# Altium footprint library TempdevAmmy.PcbLib: 42 footprints (part 2 of 3)
Each footprint in its own frame and in the unit in brackets; x right, y up, seen from the top. Pads: shape width x height; smd on the part's side, far side on the other; paste and mask are expansions set on the pad; w line width, h text height; cw(c..) or ccw(c..) is an arc to the next point about the centre after c.
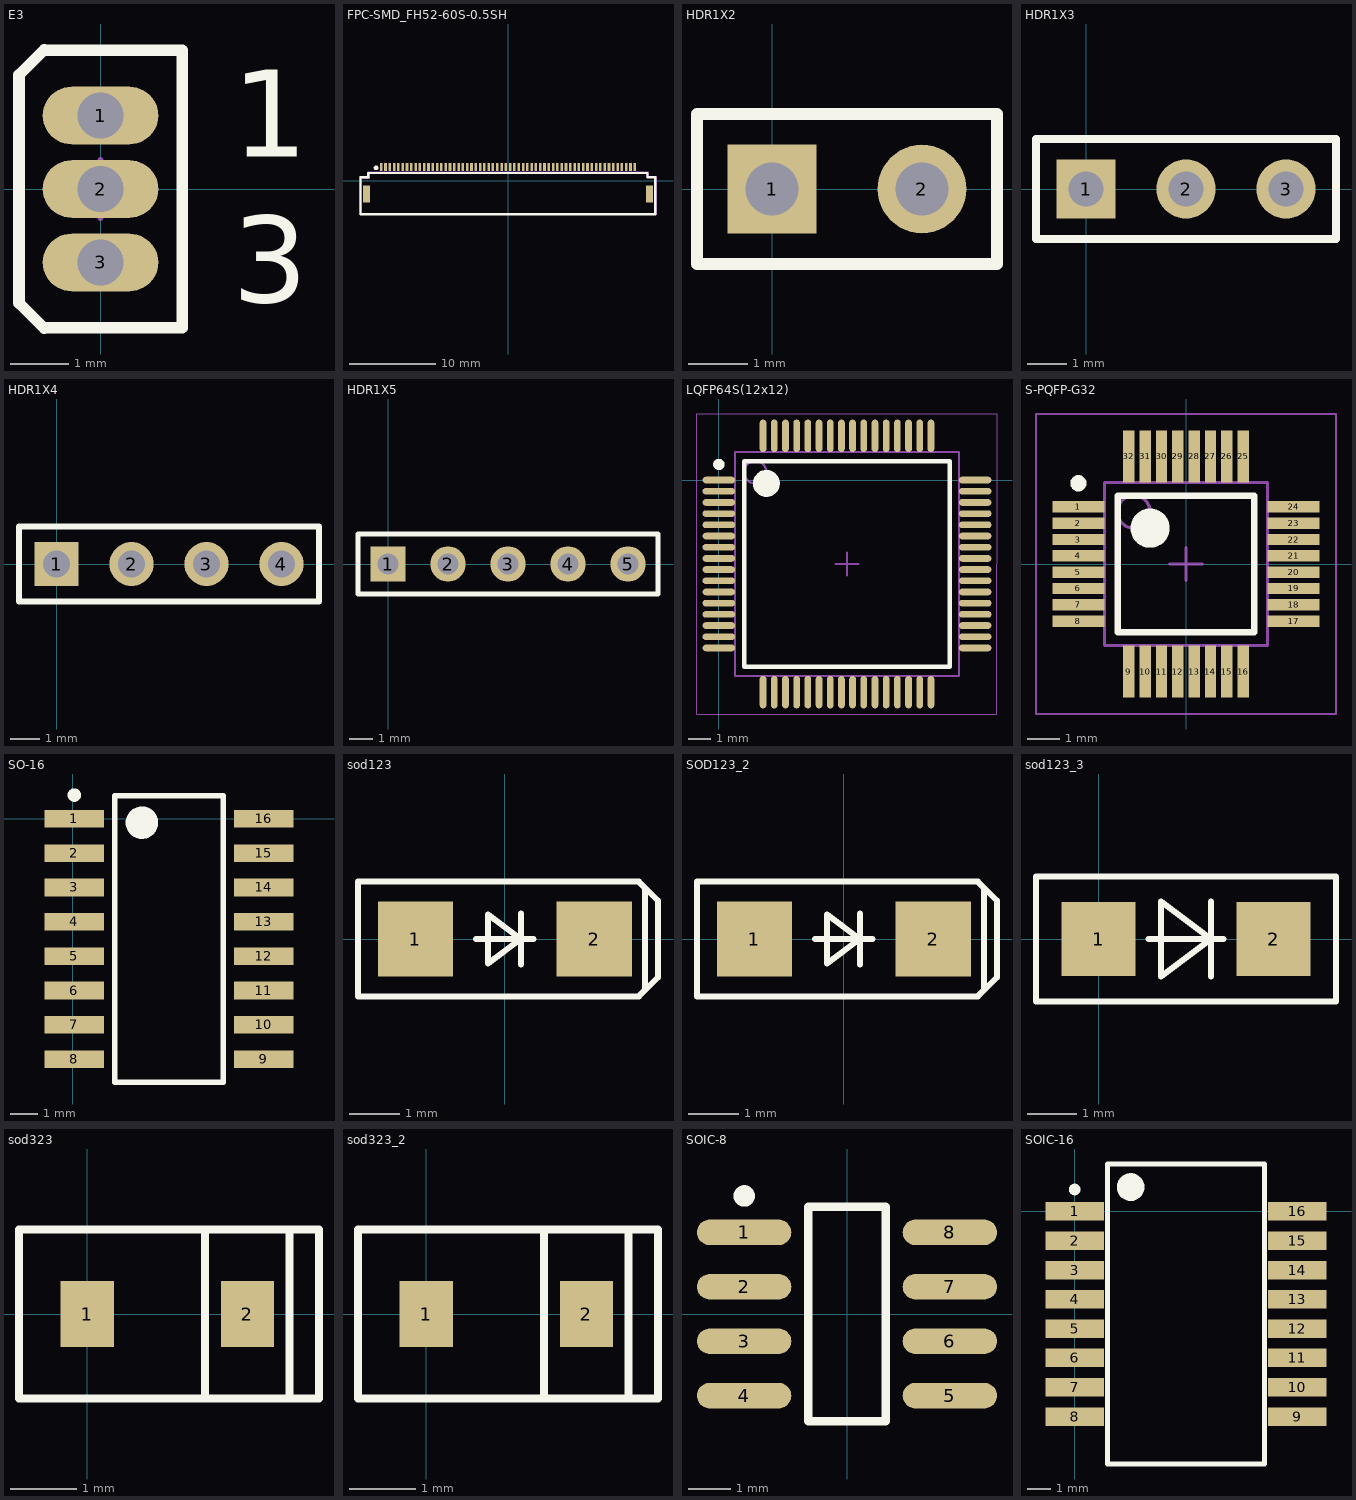
[diagram p1: the footprints below, top view; thin cyan lines are the x and y axes]

## E3 [mm] "TO, Flat Index; 3 In-Line, Axial Leads; Body Dia. 4.6mm; Lead Dia. 0.5 mm (max)"
height 4.01
pads (3):
  oval 2x1 hole 0.8: 1(0,1.27) 2(0,0) 3(0,-1.27)
Top Overlay:
  lines w0.2: -0.97,-2.41 -1.41,-1.97 -1.41,1.97 -0.97,2.41 ; -0.97,-2.4 1.41,-2.4 1.41,2.4 -0.97,2.4
  text "3" at 2.275,-1.963 h1.5
  text "1" at 2.275,0.555 h1.5
Mechanical 15:
  lines w0.1: -0.5,0 0.5,0 ; 0,-0.5 0,0.5

## FPC-SMD_FH52-60S-0.5SH [mm]
pads (62):
  rect 0.3x0.9 smd: 1(-14.75,1.575) 2(-14.25,1.575) 3(-13.75,1.575) 4(-13.25,1.575) 5(-12.75,1.575) 6(-12.25,1.575) 7(-11.75,1.575) 8(-11.25,1.575) 9(-10.75,1.575) 10(-10.25,1.575) 11(-9.75,1.575) 12(-9.25,1.575) 13(-8.75,1.575) 14(-8.25,1.575) 15(-7.75,1.575) 16(-7.25,1.575) 17(-6.75,1.575) 18(-6.25,1.575) 19(-5.75,1.575) 20(-5.25,1.575) 21(-4.75,1.575) 22(-4.25,1.575) 23(-3.75,1.575) 24(-3.25,1.575) 25(-2.75,1.575) 26(-2.25,1.575) 27(-1.75,1.575) 28(-1.25,1.575) 29(-0.75,1.575) 30(-0.25,1.575) 31(0.25,1.575) 32(0.75,1.575) 33(1.25,1.575) 34(1.75,1.575) 35(2.25,1.575) 36(2.75,1.575) 37(3.25,1.575) 38(3.75,1.575) 39(4.25,1.575) 40(4.75,1.575) 41(5.25,1.575) 42(5.75,1.575) 43(6.25,1.575) 44(6.75,1.575) 45(7.25,1.575) 46(7.75,1.575) 47(8.25,1.575) 48(8.75,1.575) 49(9.25,1.575) 50(9.75,1.575) 51(10.25,1.575) 52(10.75,1.575) 53(11.25,1.575) 54(11.75,1.575) 55(12.25,1.575) 56(12.75,1.575) 57(13.25,1.575) 58(13.75,1.575) 59(14.25,1.575) 60(14.75,1.575)
  rect 0.8x2 smd: 61(16.45,-1.575) 62(-16.45,-1.575)
Top Overlay:
  circle w0.254: c-15.35,1.475 r0.141
  lines w0.254: 15.24,0.889 16.24,0.889 16.24,0.389 17.14,0.389 17.14,-3.911 ; 15.25,0.875 -15.25,0.875 -16.25,0.875 -16.25,0.375 -17.15,0.375 -17.15,-3.925 17.15,-3.925
Mechanical 15:
  region: -17.3,-4 -17.3,0.2 -17,0.2 -17,-3.8 17.1,-3.8 17.1,0.3 16.1,0.3 16.1,0.8 -16.1,0.8 -16.1,0.2 -17,0.2 -17.3,0.2 -17.3,0.5 -16.3,0.5 -16.3,1 16.4,1 16.4,0.5 17.3,0.5 17.3,-4

## HDR1X2 [mm] "Connector; Header; 2 Position"
pads (2):
  rect 1.5x1.5 hole 0.9: 1(0,0)
  round 1.5 hole 0.9: 2(2.54,0)
Top Overlay:
  lines w0.2: -1.27,-1.27 3.81,-1.27 3.81,1.27 -1.27,1.27 -1.27,-1.27

## HDR1X3 [mm] "Connector; Header; 3 Position"
pads (3):
  rect 1.5x1.5 hole 0.9: 1(0,0)
  round 1.5 hole 0.9: 2(2.54,0) 3(5.08,0)
Top Overlay:
  lines w0.2: -1.27,-1.27 -1.27,1.27 6.35,1.27 6.35,-1.27 -1.27,-1.27

## HDR1X4 [mm] "Connector; Header; 4 Position"
pads (4):
  rect 1.5x1.5 hole 0.9: 1(0,0)
  round 1.5 hole 0.9: 2(2.54,0) 3(5.08,0) 4(7.62,0)
Top Overlay:
  lines w0.2: -1.27,-1.27 8.89,-1.27 8.89,1.27 -1.27,1.27 -1.27,-1.27

## HDR1X5 [mm] "Connector; Header; 5 Position"
pads (5):
  rect 1.5x1.5 hole 0.9: 1(0,0)
  round 1.5 hole 0.9: 2(2.54,0) 3(5.08,0) 4(7.62,0) 5(10.16,0)
Top Overlay:
  lines w0.2: -1.27,-1.27 11.43,-1.27 11.43,1.27 -1.27,1.27 -1.27,-1.27

## LQFP64S(12x12) [mm] "TSQFP, 64-Leads, Body 10.00x10.00mm, Pitch 0.50mm, IPC Medium Density"
height 1.6
pads (64):
  oval 1.45x0.3 smd: 1(0,0) 2(0,-0.5) 3(0,-1) 4(0,-1.5) 5(0,-2) 6(0,-2.5) 7(0,-3) 8(0,-3.5) 9(0,-4) 10(0,-4.5) 11(0,-5) 12(0,-5.5) 13(0,-6) 14(0,-6.5) 15(0,-7) 16(0,-7.5) 33(11.45,-7.5) 34(11.45,-7) 35(11.45,-6.5) 36(11.45,-6) 37(11.45,-5.5) 38(11.45,-5) 39(11.45,-4.5) 40(11.45,-4) 41(11.45,-3.5) 42(11.45,-3) 43(11.45,-2.5) 44(11.45,-2) 45(11.45,-1.5) 46(11.45,-1) 47(11.45,-0.5) 48(11.45,0)
  oval 0.3x1.45 smd: 17(1.975,-9.475) 18(2.475,-9.475) 19(2.975,-9.475) 20(3.475,-9.475) 21(3.975,-9.475) 22(4.475,-9.475) 23(4.975,-9.475) 24(5.475,-9.475) 25(5.975,-9.475) 26(6.475,-9.475) 27(6.975,-9.475) 28(7.475,-9.475) 29(7.975,-9.475) 30(8.475,-9.475) 31(8.975,-9.475) 32(9.475,-9.475) 49(9.475,1.975) 50(8.975,1.975) 51(8.475,1.975) 52(7.975,1.975) 53(7.475,1.975) 54(6.975,1.975) 55(6.475,1.975) 56(5.975,1.975) 57(5.475,1.975) 58(4.975,1.975) 59(4.475,1.975) 60(3.975,1.975) 61(3.475,1.975) 62(2.975,1.975) 63(2.475,1.975) 64(1.975,1.975)
Top Overlay:
  circle w0.25: c0,0.7 r0.125
  circle w0.6: c2.125,-0.15 r0.3
  lines w0.2: 1.125,-8.35 1.125,0.85 10.325,0.85 10.325,-8.35 1.125,-8.35
Mechanical 13:
  circle w0.1: c1.625,0.35 r0.5
  lines w0.1: 0.725,-8.75 0.725,1.25 10.725,1.25 10.725,-8.75 0.725,-8.75
Mechanical 15:
  lines w0.05: -0.975,-10.45 -0.975,2.95 12.425,2.95 12.425,-10.45 -0.975,-10.45
  lines w0.1: 5.225,-3.75 6.225,-3.75 ; 5.725,-4.25 5.725,-3.25
3D body: height 1.6, standoff 0.05, extent 0.725,-8.75 10.725,1.25

## S-PQFP-G32 [mm] "TSQFP, 32-Leads, Body 5.00x5.00mm, Pitch 0.50mm, IPC Low Density"
height 1.2
pads (32):
  rect 1.6x0.35 smd: 1(-3.3,1.75) 2(-3.3,1.25) 3(-3.3,0.75) 4(-3.3,0.25) 5(-3.3,-0.25) 6(-3.3,-0.75) 7(-3.3,-1.25) 8(-3.3,-1.75) 17(3.3,-1.75) 18(3.3,-1.25) 19(3.3,-0.75) 20(3.3,-0.25) 21(3.3,0.25) 22(3.3,0.75) 23(3.3,1.25) 24(3.3,1.75)
  rect 0.35x1.6 smd: 9(-1.75,-3.3) 10(-1.25,-3.3) 11(-0.75,-3.3) 12(-0.25,-3.3) 13(0.25,-3.3) 14(0.75,-3.3) 15(1.25,-3.3) 16(1.75,-3.3) 25(1.75,3.3) 26(1.25,3.3) 27(0.75,3.3) 28(0.25,3.3) 29(-0.25,3.3) 30(-0.75,3.3) 31(-1.25,3.3) 32(-1.75,3.3)
Top Overlay:
  circle w0.25: c-3.3,2.475 r0.125
  circle w0.6: c-1.1,1.1 r0.3
  lines w0.2: -2.1,-2.1 -2.1,2.1 2.1,2.1 2.1,-2.1 -2.1,-2.1
Mechanical 13:
  circle w0.1: c-1.6,1.6 r0.5
  lines w0.1: -2.5,-2.5 -2.5,2.5 2.5,2.5 2.5,-2.5 -2.5,-2.5
Mechanical 15:
  lines w0.05: -4.6,-4.6 -4.6,4.6 4.6,4.6 4.6,-4.6 -4.6,-4.6
  lines w0.1: -0.5,0 0.5,0 ; 0,-0.5 0,0.5
3D body "S-PQFP-G32.step": height 1.2, standoff 0, extent -3.5,-3.5 3.5,3.5

## SO-16 [mm]
pads (16):
  rect 2.2x0.65 smd: 1(0.056,0) 2(0.056,-1.27) 3(0.056,-2.54) 4(0.056,-3.81) 5(0.056,-5.08) 6(0.056,-6.35) 7(0.056,-7.62) 8(0.056,-8.89) 9(7.056,-8.89) 10(7.056,-7.62) 11(7.056,-6.35) 12(7.056,-5.08) 13(7.056,-3.81) 14(7.056,-2.54) 15(7.056,-1.27) 16(7.056,0)
Top Overlay:
  circle w0.25: c0.056,0.875 r0.125
  circle w0.6: c2.556,-0.145 r0.3
  lines w0.2: 1.556,-9.745 1.556,0.855 5.556,0.855 5.556,-9.745 1.556,-9.745

## sod123 [mm]
pads (2):
  rect 1.5x1.5 smd: 1(-1.778,0) 2(1.778,0)
Top Overlay:
  lines w0.12: -0.572,0 0.572,0 ; 0.318,-0.508 0.318,0.508 ; 2.794,-1.016 2.794,1.016 ; -2.921,-1.143 2.667,-1.143 3.048,-0.762 3.048,0.762 2.667,1.143 -2.921,1.143 -2.921,-1.143 ; -0.333,-0.488 -0.333,0.488 0.318,0 -0.333,-0.488

## SOD123_2 [mm]
pads (2):
  rect 1.5x1.5 smd: 1(-1.778,0) 2(1.778,0)
Top Overlay:
  lines w0.12: -0.572,0 0.572,0 ; 0.318,-0.508 0.318,0.508 ; 2.794,-1.016 2.794,1.016 ; -2.921,-1.143 2.667,-1.143 3.048,-0.762 3.048,0.762 2.667,1.143 -2.921,1.143 -2.921,-1.143 ; -0.333,-0.488 -0.333,0.488 0.318,0 -0.333,-0.488

## sod123_3 [mm]
pads (2):
  rect 1.5x1.5 smd: 1(0,0) 2(3.556,0)
Top Overlay:
  lines w0.12: 1.016,0 2.54,0 ; 2.286,-0.762 2.286,0.762 ; -1.27,-1.27 4.826,-1.27 4.826,1.27 -1.27,1.27 -1.27,-1.27 ; 1.27,-0.762 1.27,0.762 2.286,0 1.27,-0.762
3D body "CircuitWorks-SOD123.step": height 1.27, standoff 0, extent -0.199,-0.8 3.501,0.8

## sod323 [mm]
pads (2):
  rect 0.8x1 smd: 1(0,0) 2(2.413,0)
Top Overlay:
  lines w0.12: 1.778,-1.27 1.778,1.27 ; 3.048,-1.27 3.048,1.27 ; -1.028,-1.27 3.493,-1.27 3.493,1.27 -1.028,1.27 -1.028,-1.27

## sod323_2 [mm]
pads (2):
  rect 0.8x1 smd: 1(0,0) 2(2.413,0)
Top Overlay:
  lines w0.12: 1.778,-1.27 1.778,1.27 ; 3.048,-1.27 3.048,1.27 ; -1.028,-1.27 -1.028,1.27 3.493,1.27 3.493,-1.27 -1.028,-1.27
3D body "User Library-SOD-323.step": height 1.1, standoff 0, extent -0.157,-0.675 2.443,0.675

## SOIC-8 [mm]
pads (8):
  oval 2.2x0.6 smd: 1(-2.4,1.905) 2(-2.4,0.635) 3(-2.4,-0.635) 4(-2.4,-1.905) 5(2.4,-1.905) 6(2.4,-0.635) 7(2.4,0.635) 8(2.4,1.905)
Top Overlay:
  circle w0.25: c-2.4,2.755 r0.125
  lines w0.2: -0.9,-2.5 0.9,-2.5 0.9,2.5 -0.9,2.5 -0.9,-2.5

## SOIC-16 [mm]
pads (16):
  rect 2.54x0.8 smd: 1(0,0) 2(0,-1.27) 3(0,-2.54) 4(0,-3.81) 5(0,-5.08) 6(0,-6.35) 7(0,-7.62) 8(0,-8.89) 9(9.65,-8.89) 10(9.65,-7.62) 11(9.65,-6.35) 12(9.65,-5.08) 13(9.65,-3.81) 14(9.65,-2.54) 15(9.65,-1.27) 16(9.65,0)
Top Overlay:
  circle w0.25: c0,0.95 r0.125
  circle w0.6: c2.425,1.055 r0.3
  lines w0.2: 1.425,-10.945 1.425,2.055 8.225,2.055 8.225,-10.945 1.425,-10.945